# Altium footprint library Library.PcbLib: 298 footprints (part 12 of 19)
Each footprint in its own frame and in the unit in brackets; x right, y up, seen from the top. Pads: shape width x height; smd on the part's side, far side on the other; paste and mask are expansions set on the pad; w line width, h text height; cw(c..) or ccw(c..) is an arc to the next point about the centre after c.
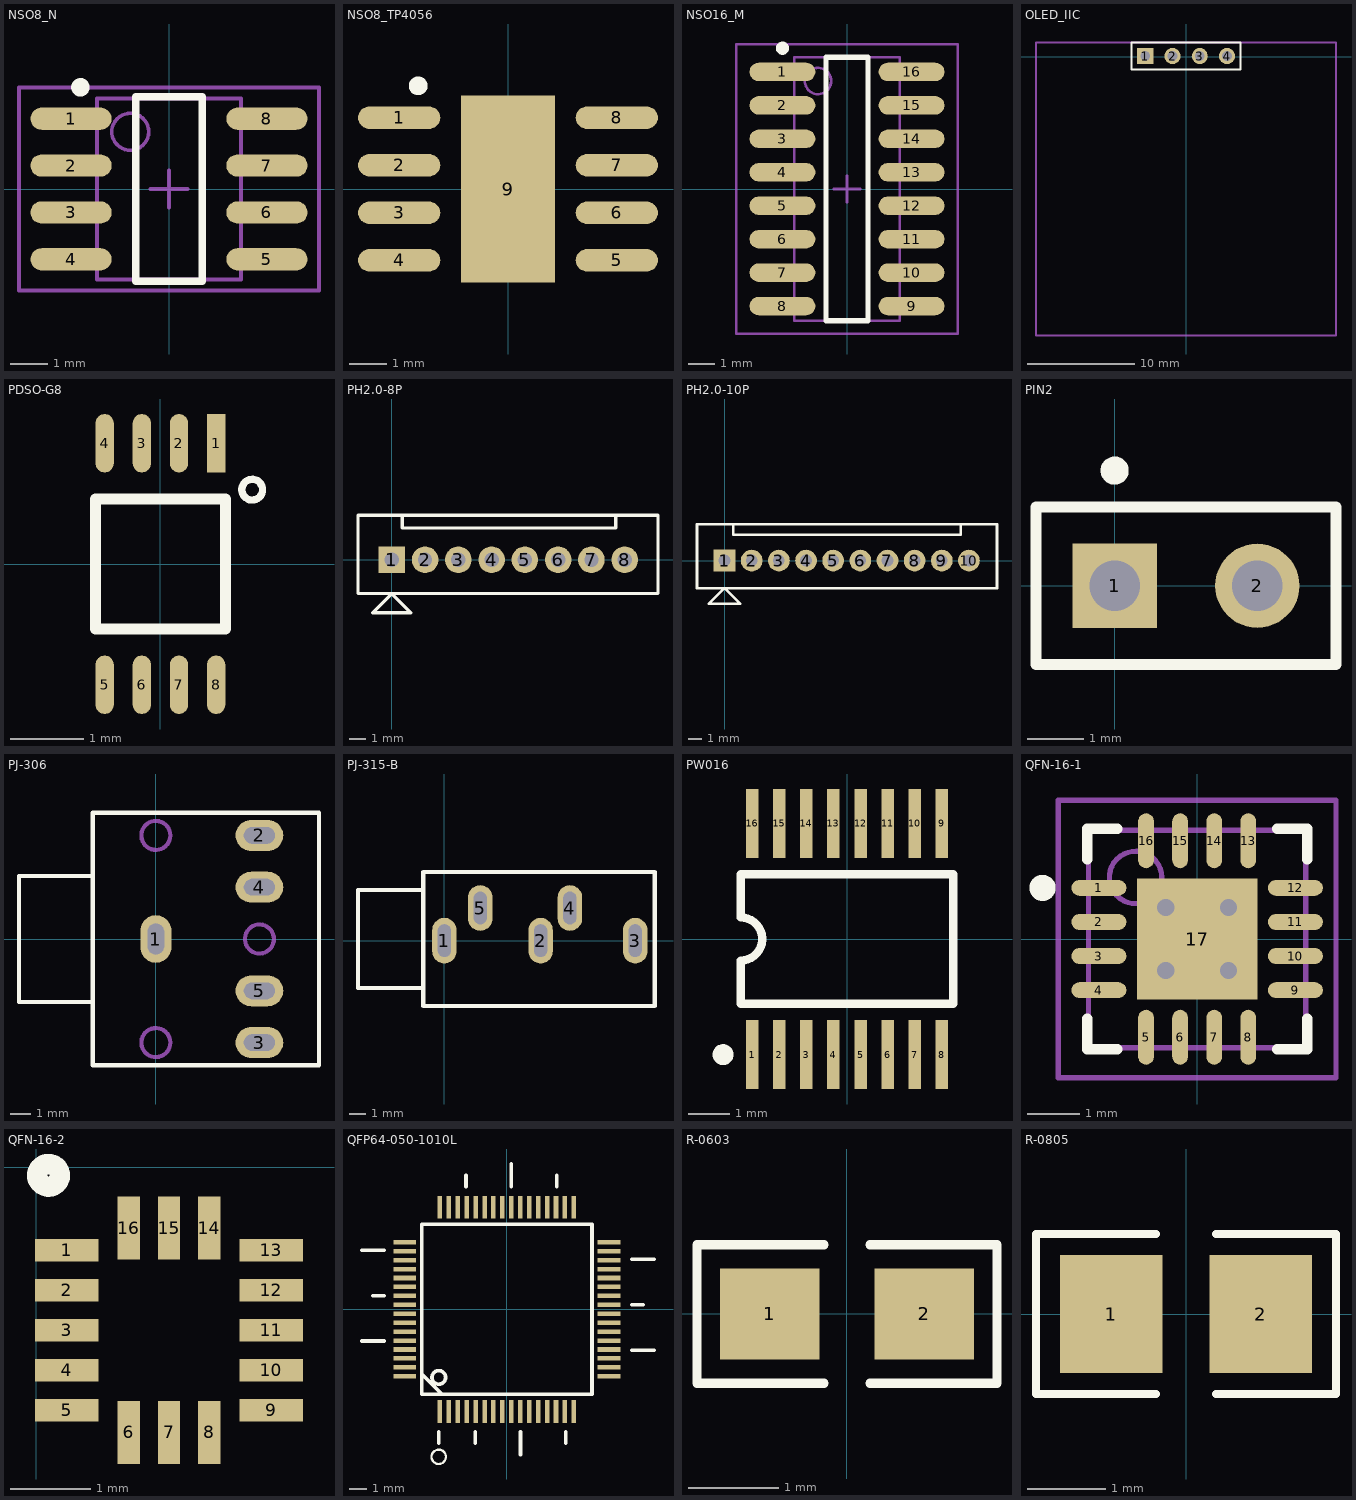
[diagram p11: the footprints below, top view; thin cyan lines are the x and y axes]

## NSO8_N [mm] "SOIC-max660"
height 1.75
pads (8):
  oval 2.2x0.6 smd: 1(-2.654,1.905) 2(-2.654,0.635) 3(-2.654,-0.635) 4(-2.654,-1.905) 5(2.654,-1.905) 6(2.654,-0.635) 7(2.654,0.635) 8(2.654,1.905)
Top Overlay:
  circle w0.25: c-2.4,2.755 r0.125
  lines w0.2: -0.9,-2.5 -0.9,2.5 0.9,2.5 0.9,-2.5 -0.9,-2.5
Mechanical 13:
  circle w0.1: c-1.05,1.55 r0.5
  lines w0.1: -1.95,-2.45 -1.95,2.45 1.95,2.45 1.95,-2.45 -1.95,-2.45
Mechanical 15:
  lines w0.1: -0.5,0 0.5,0 ; 0,-0.5 0,0.5 ; -4.064,-2.75 -4.064,2.75 4.064,2.75 4.064,-2.75 -4.064,-2.75
3D body: height 1.75, standoff 0, extent -1.95,-2.45 1.95,2.45

## NSO8_TP4056 [mm] "SOIC-max660"
height 1.75
pads (9):
  oval 2.2x0.6 smd: 1(-2.908,1.905) 2(-2.908,0.635) 3(-2.908,-0.635) 4(-2.908,-1.905) 5(2.908,-1.905) 6(2.908,-0.635) 7(2.908,0.635) 8(2.908,1.905)
  rect 2.5x5 smd: 9(0,0)
Top Overlay:
  circle w0.25: c-2.4,2.755 r0.125

## NSO16_M [mm] "SOIC, 16-Leads, Body 9.9x3.9mm, Pitch 1.27mm, IPC Low Density"
height 1.75
pads (16):
  oval 2.5x0.7 smd: 1(-2.45,4.445) 2(-2.45,3.175) 3(-2.45,1.905) 4(-2.45,0.635) 5(-2.45,-0.635) 6(-2.45,-1.905) 7(-2.45,-3.175) 8(-2.45,-4.445) 9(2.45,-4.445) 10(2.45,-3.175) 11(2.45,-1.905) 12(2.45,-0.635) 13(2.45,0.635) 14(2.45,1.905) 15(2.45,3.175) 16(2.45,4.445)
Top Overlay:
  circle w0.25: c-2.45,5.345 r0.125
  lines w0.2: -0.8,-5 0.8,-5 0.8,5 -0.8,5 -0.8,-5
Mechanical 13:
  circle w0.1: c-1.1,4.1 r0.5
  lines w0.1: -2,-5 2,-5 2,5 -2,5 -2,-5
Mechanical 15:
  lines w0.1: -0.5,0 0.5,0 ; 0,-0.5 0,0.5 ; -4.2,-5.5 4.2,-5.5 4.2,5.5 -4.2,5.5 -4.2,-5.5
3D body: height 1.75, standoff 0, extent -2,-5 2,5

## OLED_IIC [mm]
height 7
pads (4):
  rect 1.5x1.5 hole 0.9: 1(-3.81,0.076)
  round 1.5 hole 0.9: 2(-1.27,0.076) 3(1.27,0.076) 4(3.81,0.076)
Top Overlay:
  lines w0.2: -5.105,-1.168 5.08,-1.168 5.08,1.321 5.08,1.346 -5.105,1.346 -5.105,-1.168
Mechanical 15:
  lines w0.2: -13.995,-25.984 13.97,-25.984 13.97,1.346 -13.995,1.346 -13.995,-25.984
3D body "HDR2.54-1P.STEP": height 8.5, standoff -3, extent 2.54,-1.194 5.08,1.346
3D body "HDR2.54-1P.STEP": height 8.5, standoff -3, extent 0,-1.194 2.54,1.346
3D body "HDR2.54-1P.STEP": height 8.5, standoff -3, extent -2.54,-1.194 0,1.346
3D body "HDR2.54-1P.STEP": height 8.5, standoff -3, extent -5.08,-1.194 -2.54,1.346

## PDSO-G8 [mm] "U"
height 4
pads (8):
  rect 0.25x0.8 smd: 1(0.762,1.651)
  oval 0.25x0.8 smd: 2(0.254,1.651) 3(-0.254,1.651) 4(-0.762,1.651) 5(-0.762,-1.651) 6(-0.254,-1.651) 7(0.254,-1.651) 8(0.762,-1.651)
Top Overlay:
  circle w0.1: c1.255,1.016 r0.142
  lines w0.15: -0.889,-0.889 -0.889,0.889 0.889,0.889 0.889,-0.889 -0.889,-0.889

## PH2.0-8P [mm]
height 10
pads (8):
  rect 1.6x1.6 hole 0.86: 1(0,0)
  round 1.6 hole 0.86: 2(2,0) 3(4,0) 4(6,0) 5(8,0) 6(10,0) 7(12,0) 8(14,0)
Top Overlay:
  lines w0.2: 0.635,2.667 0.635,1.905 13.462,1.905 13.462,2.667 ; -2.032,-2.032 -2.032,2.667 16.002,2.667 16.002,-2.032 -2.032,-2.032 ; -1.143,-3.175 0,-2.032 1.143,-3.175 -1.143,-3.175

## PH2.0-10P [mm]
height 10
pads (10):
  rect 1.6x1.6 hole 0.86: 1(0,0)
  round 1.6 hole 0.86: 2(2,0) 3(4,0) 4(6,0) 5(8,0) 6(10,0) 7(12,0) 8(14,0) 9(16,0) 10(18,0)
Top Overlay:
  lines w0.2: 0.635,2.667 0.635,1.905 17.399,1.905 17.399,2.667 ; -2.032,-2.032 20.066,-2.032 20.066,2.667 -2.032,2.667 -2.032,-2.032 ; -1.143,-3.175 1.143,-3.175 0,-2.032 -1.143,-3.175

## PIN2 [mm] "Photosensitive Diode; 2 Leads"
height 2.6
pads (2):
  rect 1.5x1.5 hole 0.9: 1(0,0)
  round 1.5 hole 0.9: 2(2.54,0)
Top Overlay:
  circle w0.25: c0,2.05 r0.125
  lines w0.2: -1.4,-1.4 -1.4,1.4 3.94,1.4 3.94,-1.4 -1.4,-1.4
3D body "HDR2.54-1P.STEP": height 8.5, standoff -3, extent -1.27,-1.27 1.27,1.27
3D body "HDR2.54-1P.STEP": height 8.5, standoff -3, extent 1.27,-1.27 3.81,1.27

## PJ-306 [mm] "立体声耳机插座"
pads (5):
  oval 1.5x2.3 hole 0.8 slot 1.5 at 90 deg: 1(0,0)
  oval 2.3x1.5 hole 0.8 slot 1.5 at 0 deg: 2(5,5) 3(5,-5) 4(5,2.5) 5(5,-2.5)
Top Overlay:
  lines w0.2: -3.048,-3.048 -6.604,-3.048 -6.604,3.048 -3.048,3.048 ; -3.048,-6.096 -3.048,0 -3.048,6.096 7.874,6.096 7.874,-6.096 -3.048,-6.096
Mechanical 1:
  circle w0.2: c5,0 r0.7
  circle w0.2: c0,5 r0.7
  circle w0.2: c0,-5 r0.7

## PJ-315-B [mm] "立体声耳机插座"
pads (5):
  oval 1.5x2.8 hole 0.8 slot 2 at 90 deg: 1(0,0) 2(5.9,0) 3(11.7,0) 4(7.7,2) 5(2.2,2)
Top Overlay:
  lines w0.254: -1.3,-2.9 -5.3,-2.9 -5.3,3.1 -1.3,3.1 ; -1.3,-4 12.9,-4 12.9,4.2 -1.3,4.2 -1.3,-4

## PW016 [mm] "Shrink Small Outline; 16 Leads; Body Width 4.4 mm; Pitch 0.65 mm"
height 1.2
pads (16):
  rect 0.3x1.65 smd: 1(-2.275,-2.775) 2(-1.625,-2.775) 3(-0.975,-2.775) 4(-0.325,-2.775) 5(0.325,-2.775) 6(0.975,-2.775) 7(1.625,-2.775) 8(2.275,-2.775) 9(2.275,2.775) 10(1.625,2.775) 11(0.975,2.775) 12(0.325,2.775) 13(-0.325,2.775) 14(-0.975,2.775) 15(-1.625,2.775) 16(-2.275,2.775)
Top Overlay:
  circle w0.25: c-2.975,-2.775 r0.125
  lines w0.2: -2.55,-1.55 2.55,-1.55 2.55,1.55 -2.55,1.55 -2.55,0.517 cw(c-2.55,0) -2.55,-0.517 -2.55,-1.55

## QFN-16-1 [mm] "QFN"
height 0.8
pads (17):
  oval 1.05x0.3 smd: 1(-1.875,0.975) 2(-1.875,0.325) 3(-1.875,-0.325) 4(-1.875,-0.975) 9(1.875,-0.975) 10(1.875,-0.325) 11(1.875,0.325) 12(1.875,0.975)
  oval 0.3x1.05 smd: 5(-0.975,-1.875) 6(-0.325,-1.875) 7(0.325,-1.875) 8(0.975,-1.875) 13(0.975,1.875) 14(0.325,1.875) 15(-0.325,1.875) 16(-0.975,1.875)
  rect 2.3x2.3 smd: 17(0,0)
via 0.6,-0.6 diameter 0.66 hole 0.33
via -0.6,-0.6 diameter 0.66 hole 0.33
via 0.6,0.6 diameter 0.66 hole 0.33
via -0.6,0.6 diameter 0.66 hole 0.33
Top Overlay:
  circle w0.25: c-2.95,0.975 r0.125
  lines w0.2: -2.1,-1.525 -2.1,-2.1 -1.525,-2.1 ; -2.1,1.525 -2.1,2.1 -1.525,2.1 ; 1.525,-2.1 2.1,-2.1 2.1,-1.525 ; 1.525,2.1 2.1,2.1 2.1,1.525
Mechanical 13:
  circle w0.1: c-1.175,1.175 r0.5
  lines w0.1: -2.075,-2.075 2.075,-2.075 2.075,2.075 -2.075,2.075 -2.075,-2.075
Mechanical 15:
  lines w0.1: -0.5,0 0.5,0 ; 0,-0.5 0,0.5 ; -2.65,-2.65 2.65,-2.65 2.65,2.65 -2.65,2.65 -2.65,-2.65
3D body: height 0.8, standoff 0, extent -2.075,-2.075 2.075,2.075

## QFN-16-2 [mm]
pads (16):
  rect 0.787x0.28 smd: 1(0.381,-1.032) 2(0.381,-1.532) 3(0.381,-2.032) 4(0.381,-2.532) 5(0.381,-3.032) 9(2.931,-3.032) 10(2.931,-2.532) 11(2.931,-2.032) 12(2.931,-1.532) 13(2.931,-1.032)
  rect 0.28x0.787 smd: 6(1.156,-3.307) 7(1.656,-3.307) 8(2.156,-3.307) 14(2.156,-0.757) 15(1.656,-0.757) 16(1.156,-0.757)
Top Overlay:
  lines w0.254: 0.217,0.026 ccw(c0.154,-0.1) 0.254,0

## QFP64-050-1010L [mil]
pads (64):
  rect 10x50 smd: 1(-147.42,-224.72) 2(-127.74,-224.72) 3(-108.05,-224.72) 4(-88.37,-224.72) 5(-68.68,-224.72) 6(-49,-224.72) 7(-29.31,-224.72) 8(-9.63,-224.72) 9(10.06,-224.72) 10(29.74,-224.72) 11(49.43,-224.72) 12(69.11,-224.72) 13(88.8,-224.72) 14(108.48,-224.72) 15(128.17,-224.72) 16(147.85,-224.72) 33(147.85,225.28) 34(128.17,225.28) 35(108.48,225.28) 36(88.8,225.28) 37(69.11,225.28) 38(49.43,225.28) 39(29.74,225.28) 40(10.06,225.28) 41(-9.63,225.28) 42(-29.31,225.28) 43(-49,225.28) 44(-68.68,225.28) 45(-88.37,225.28) 46(-108.05,225.28) 47(-127.74,225.28) 48(-147.42,225.28)
  rect 50x10 smd: 17(225.21,-147.35) 18(225.21,-127.67) 19(225.21,-107.98) 20(225.21,-88.3) 21(225.21,-68.61) 22(225.21,-48.93) 23(225.21,-29.24) 24(225.21,-9.56) 25(225.21,10.13) 26(225.21,29.81) 27(225.21,49.5) 28(225.21,69.18) 29(225.21,88.87) 30(225.21,108.55) 31(225.21,128.24) 32(225.21,147.92) 49(-224.79,147.92) 50(-224.79,128.24) 51(-224.79,108.55) 52(-224.79,88.87) 53(-224.79,69.18) 54(-224.79,49.5) 55(-224.79,29.81) 56(-224.79,10.13) 57(-224.79,-9.56) 58(-224.79,-29.24) 59(-224.79,-48.93) 60(-224.79,-68.61) 61(-224.79,-88.3) 62(-224.79,-107.98) 63(-224.79,-127.67) 64(-224.79,-147.35)
Top Overlay:
  circle w5: c-149.79,-324.72 r15.81
  circle w8: c-149.79,-149.72 r15
  lines w8: -319.79,-69.72 -269.79,-69.72 ; -319.79,130.28 -269.79,130.28 ; -294.79,30.28 -269.79,30.28 ; -184.79,-144.72 -144.79,-184.72 ; -149.79,-294.72 -149.79,-269.72 ; -89.79,270.28 -89.79,295.28 ; -69.79,-294.72 -69.79,-269.72 ; 10.21,270.28 10.21,320.28 ; 30.21,-319.72 30.21,-269.72 ; 110.21,270.28 110.21,295.28 ; 130.21,-294.72 130.21,-269.72 ; 275.21,-89.72 325.21,-89.72 ; 275.21,10.28 300.21,10.28 ; 275.21,110.28 325.21,110.28 ; -187.29,-187.22 -187.29,187.78 187.71,187.78 187.71,-187.22 -187.29,-187.22

## R-0603 [mm] "贴片带丝印"
height 0.6
pads (2):
  rect 1.1x1 smd: 1(-0.85,0) 2(0.85,0)
Top Overlay:
  lines w0.1: -0.254,-0.762 -1.651,-0.762 -1.651,0.762 -0.254,0.762 ; 0.254,-0.762 1.651,-0.762 1.651,0.762 0.254,0.762
3D body "C 0603.STEP": height 0.81, standoff -0.01, extent -0.8,-0.41 0.8,0.41

## R-0805 [mm] "贴片带丝印"
height 1.1
pads (2):
  rect 1.3x1.5 smd: 1(-0.95,0) 2(0.95,0)
Top Overlay:
  lines w0.1: -0.381,-1.016 -1.905,-1.016 -1.905,1.016 -0.381,1.016 ; 0.381,-1.016 1.905,-1.016 1.905,1.016 0.381,1.016
3D body "C 0805.STEP": height 0.51, standoff -0.01, extent -1,-0.61 1,0.61